# Altium footprint library LukaLIBRARY.PcbLib: 772 footprints (part 20 of 49)
Each footprint in its own frame and in the unit in brackets; x right, y up, seen from the top. Pads: shape width x height; smd on the part's side, far side on the other; paste and mask are expansions set on the pad; w line width, h text height; cw(c..) or ccw(c..) is an arc to the next point about the centre after c.
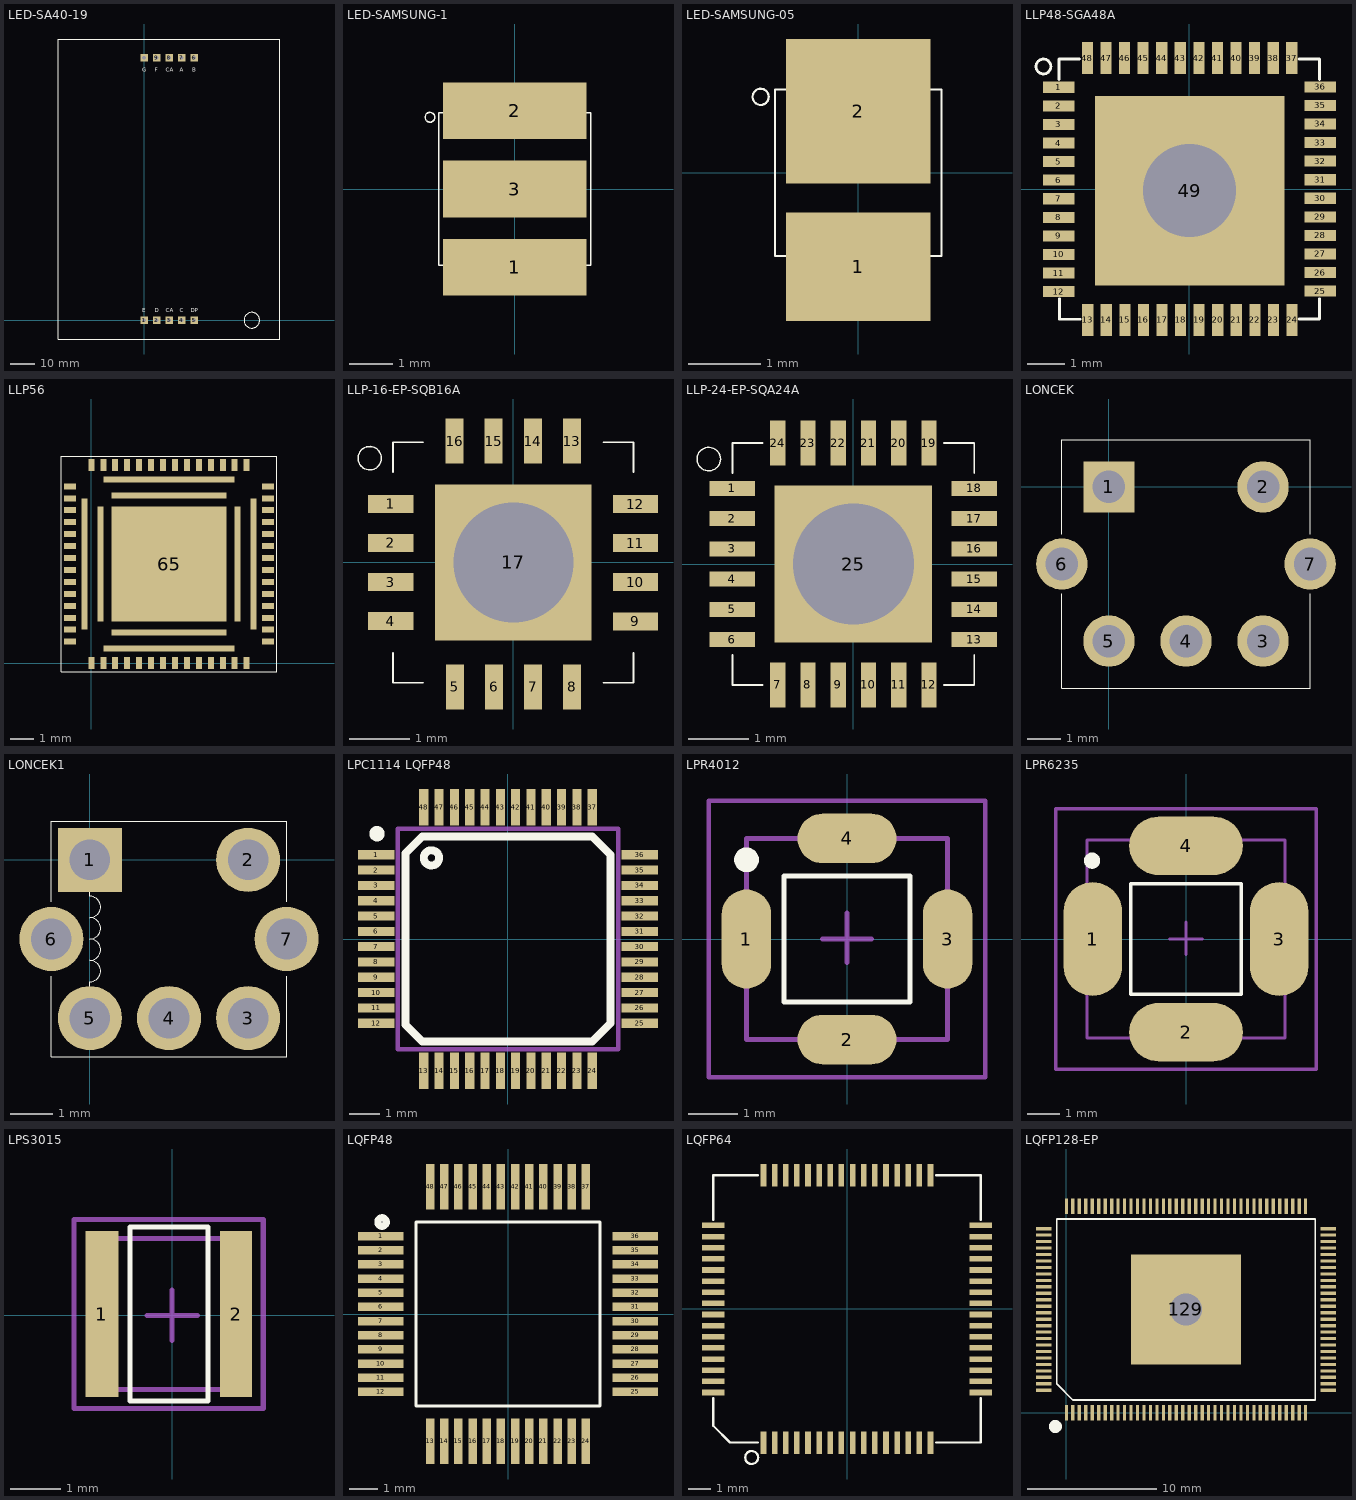
[diagram p19: the footprints below, top view; thin cyan lines are the x and y axes]

## LED-SA40-19 [mil]
pads (10):
  rect 120x120 hole 60 mask-1000: 1(0,0) 2(200,0) 3(400,0) 4(600,0) 5(800,0) 6(800,4200) 7(600,4200) 8(400,4200) 9(200,4200) 10(0,4200)
Top Overlay:
  circle w3.94: c1725,0 r125
  lines w3.94: -1375,-300 2175,-300 2175,4500 -1375,4500 -1375,-300
  text "A" at 575,3975 h62.5
  text "C" at 575,125 h62.5
  text "G" at -25,3975 h62.5
  text "E" at -25,125 h62.5
  text "B" at 775,3975 h62.5
  text "DP" at 750,125 h62.5
  text "CA" at 350,3975 h62.5
  text "CA" at 350,125 h62.5
  text "F" at 175,3975 h62.5
  text "D" at 175,125 h62.5
Top Solder:
  region: 660,4140 660,4260 540,4260 540,4140
  region: 660,-60 660,60 540,60 540,-60
  region: 60,4140 60,4260 -60,4260 -60,4140
  region: 60,-60 60,60 -60,60 -60,-60
  region: 860,4140 860,4260 740,4260 740,4140
  region: 860,-60 860,60 740,60 740,-60
  region: 460,4140 460,4260 340,4260 340,4140
  region: 460,-60 460,60 340,60 340,-60
  region: 260,4140 260,4260 140,4260 140,4140
  region: 260,-60 260,60 140,60 140,-60
Bottom Solder:
  region: 660,4140 660,4260 540,4260 540,4140
  region: 660,-60 660,60 540,60 540,-60
  region: 60,4140 60,4260 -60,4260 -60,4140
  region: 60,-60 60,60 -60,60 -60,-60
  region: 860,4140 860,4260 740,4260 740,4140
  region: 860,-60 860,60 740,60 740,-60
  region: 460,4140 460,4260 340,4260 340,4140
  region: 460,-60 460,60 340,60 340,-60
  region: 260,4140 260,4260 140,4260 140,4140
  region: 260,-60 260,60 140,60 140,-60

## LED-SAMSUNG-1 [mm]
pads (3):
  rect 3.3x1.3 smd: 1(0,-1.8) 2(0,1.8) 3(0,0)
Top Overlay:
  circle w0.03: c-1.95,1.65 r0.112
  lines w0.03: -1.75,-1.75 1.75,-1.75 1.75,1.75 -1.75,1.75 -1.75,-1.75

## LED-SAMSUNG-05 [mm]
pads (2):
  rect 2x1.5 smd: 1(0,-1.3)
  rect 2x2 smd: 2(0,0.85)
Top Overlay:
  circle w0.03: c-1.35,1.05 r0.112
  lines w0.03: -1.15,-1.15 1.15,-1.15 1.15,1.15 -1.15,1.15 -1.15,-1.15

## LLP48-SGA48A [mm]
pads (49):
  rect 0.85x0.3 smd mask-25.4: 1(-3.521,2.742) 2(-3.521,2.242) 3(-3.521,1.742) 4(-3.521,1.242) 5(-3.521,0.742) 6(-3.521,0.242) 7(-3.521,-0.258) 8(-3.521,-0.758) 9(-3.521,-1.258) 10(-3.521,-1.758) 11(-3.521,-2.258) 12(-3.521,-2.758) 25(3.519,-2.745) 26(3.519,-2.245) 27(3.519,-1.745) 28(3.519,-1.245) 29(3.519,-0.745) 30(3.519,-0.245) 31(3.519,0.255) 32(3.519,0.755) 33(3.519,1.255) 34(3.519,1.755) 35(3.519,2.255) 36(3.519,2.755)
  rect 0.3x0.85 smd mask-25.4: 13(-2.74,-3.522) 14(-2.24,-3.522) 15(-1.74,-3.522) 16(-1.24,-3.522) 17(-0.74,-3.522) 18(-0.24,-3.522) 19(0.26,-3.522) 20(0.76,-3.522) 21(1.26,-3.522) 22(1.76,-3.522) 23(2.26,-3.522) 24(2.76,-3.522) 37(2.753,3.531) 38(2.253,3.531) 39(1.753,3.531) 40(1.253,3.531) 41(0.753,3.531) 42(0.253,3.531) 43(-0.247,3.531) 44(-0.747,3.531) 45(-1.247,3.531) 46(-1.747,3.531) 47(-2.247,3.531) 48(-2.747,3.531)
  rect 5.1x5.1 hole 2.5 unplated mask-25.4: 49(0.003,-0.039)
Top Overlay:
  circle w0.076: c-3.932,3.302 r0.2
  lines w0.076: -3.509,2.95 -3.509,3.5 -2.959,3.5 ; -3.5,-3.5 -2.95,-3.5 ; -3.498,-3.499 -3.498,-2.949 ; 2.948,-3.498 3.498,-3.498 ; 2.948,3.501 3.498,3.501 ; 3.5,-3.498 3.5,-2.948 ; 3.5,2.952 3.5,3.502
Top Solder:
  drawing of 49 lines, arcs and shapes, not listed
Bottom Solder:
  region: -2.559,-0.039 -2.51,-0.539 -2.364,-1.02 -2.128,-1.463 -1.809,-1.851 -1.421,-2.17 -0.978,-2.406 -0.497,-2.552 0.003,-2.601 0.503,-2.552 0.984,-2.406 1.427,-2.17 1.815,-1.851 2.133,-1.463 2.37,-1.02 2.516,-0.539 2.565,-0.039 2.516,0.461 2.37,0.942 2.133,1.385 1.815,1.773 1.427,2.092 0.984,2.328 0.503,2.474 0.003,2.523 -0.497,2.474 -0.978,2.328 -1.421,2.092 -1.809,1.773 -2.128,1.385 -2.364,0.942 -2.51,0.461

## LLP56 [mm]
pads (65):
  rect 0.25x0.5 smd paste-25.4 mask-25.4: 1(0,0) 2(0.5,0) 3(1,0) 4(1.5,0) 5(2,0) 6(2.5,0) 7(3,0) 8(3.5,0) 9(4,0) 10(4.5,0) 11(5,0) 12(5.5,0) 13(6,0) 14(6.5,0) 29(6.5,8.3) 30(6,8.3) 31(5.5,8.3) 32(5,8.3) 33(4.5,8.3) 34(4,8.3) 35(3.5,8.3) 36(3,8.3) 37(2.5,8.3) 38(2,8.3) 39(1.5,8.3) 40(1,8.3) 41(0.5,8.3) 42(0,8.3)
  rect 0.5x0.25 smd paste-25.4 mask-25.4: 15(7.4,0.9) 16(7.4,1.4) 17(7.4,1.9) 18(7.4,2.4) 19(7.4,2.9) 20(7.4,3.4) 21(7.4,3.9) 22(7.4,4.4) 23(7.4,4.9) 24(7.4,5.4) 25(7.4,5.9) 26(7.4,6.4) 27(7.4,6.9) 28(7.4,7.4) 43(-0.9,7.4) 44(-0.9,6.9) 45(-0.9,6.4) 46(-0.9,5.9) 47(-0.9,5.4) 48(-0.9,4.9) 49(-0.9,4.4) 50(-0.9,3.9) 51(-0.9,3.4) 52(-0.9,2.9) 53(-0.9,2.4) 54(-0.9,1.9) 55(-0.9,1.4) 56(-0.9,0.9)
  rect 5.5x0.25 smd mask-25.4: 57(3.25,0.625) 61(3.25,7.675)
  rect 4.8x0.25 smd mask-25.4: 58(3.25,1.275) 62(3.25,7.025)
  rect 0.25x5.5 smd mask-25.4: 59(-0.275,4.15) 63(6.775,4.15)
  rect 0.25x4.8 smd mask-25.4: 60(0.375,4.15) 64(6.125,4.15)
  rect 4.8x4.8 smd mask-25.4: 65(3.25,4.15)
Top Overlay:
  lines w0.025: -1.25,-0.35 -1.25,8.65 7.75,8.65 7.75,-0.35 -1.25,-0.35
Top Paste:
  drawing of 152 lines, arcs and shapes, not listed
Top Solder:
  drawing of 65 lines, arcs and shapes, not listed

## LLP-16-EP-SQB16A [mm]
pads (17):
  rect 0.75x0.3 smd mask-25.4: 1(-2.04,0.975) 2(-2.04,0.325) 3(-2.04,-0.325) 4(-2.04,-0.975) 9(2.03,-0.978) 10(2.03,-0.327) 11(2.03,0.323) 12(2.03,0.972)
  rect 0.3x0.75 smd mask-25.4: 5(-0.972,-2.07) 6(-0.323,-2.07) 7(0.327,-2.07) 8(0.978,-2.07) 13(0.972,2.02) 14(0.323,2.02) 15(-0.327,2.02) 16(-0.978,2.02)
  rect 2.6x2.6 hole 2 unplated mask-25.4: 17(0,0)
Top Overlay:
  circle w0.025: c-2.39,1.735 r0.194
  lines w0.03: -2,-1.5 -2,-2 -1.5,-2 ; -2,1.5 -2,2 -1.5,2 ; 1.5,-2 2,-2 2,-1.5 ; 1.5,2 2,2 2,1.5
Top Solder:
  region: -1.665,0.825 -1.665,1.125 -2.415,1.125 -2.415,0.825
  region: -1.665,0.175 -1.665,0.475 -2.415,0.475 -2.415,0.175
  region: -1.665,-0.475 -1.665,-0.175 -2.415,-0.175 -2.415,-0.475
  region: -1.665,-1.125 -1.665,-0.825 -2.415,-0.825 -2.415,-1.125
  region: -0.473,-2.445 -0.173,-2.445 -0.173,-1.695 -0.473,-1.695
  region: 0.477,-1.695 0.178,-1.695 0.178,-2.445 0.477,-2.445
  region: 0.473,2.395 0.173,2.395 0.173,1.645 0.473,1.645
  region: -0.477,1.645 -0.178,1.645 -0.178,2.395 -0.477,2.395
  region: -0.828,2.395 -1.128,2.395 -1.128,1.645 -0.828,1.645
  region: -0.823,-1.695 -1.122,-1.695 -1.122,-2.445 -0.823,-2.445
  region: 2.405,-1.128 2.405,-0.828 1.655,-0.828 1.655,-1.128
  region: 2.405,-0.477 2.405,-0.178 1.655,-0.178 1.655,-0.477
  region: 2.405,0.173 2.405,0.473 1.655,0.473 1.655,0.173
  region: 2.405,0.823 2.405,1.122 1.655,1.122 1.655,0.823
  region: 0.828,-2.445 1.128,-2.445 1.128,-1.695 0.828,-1.695
  region: 1.122,2.395 0.823,2.395 0.823,1.645 1.122,1.645
  region: -1.3,-1.3 1.3,-1.3 1.3,1.3 -1.3,1.3
Bottom Solder:
  region: -1.5,-1.5 1.5,-1.5 1.5,1.5 -1.5,1.5

## LLP-24-EP-SQA24A [mm]
pads (25):
  rect 0.75x0.25 smd mask-25.4: 1(-2,1.25) 2(-2,0.75) 3(-2,0.25) 4(-2,-0.25) 5(-2,-0.75) 6(-2,-1.25) 13(2,-1.25) 14(2,-0.75) 15(2,-0.25) 16(2,0.25) 17(2,0.75) 18(2,1.25)
  rect 0.25x0.75 smd mask-25.4: 7(-1.25,-2) 8(-0.75,-2) 9(-0.25,-2) 10(0.25,-2) 11(0.75,-2) 12(1.25,-2) 19(1.25,2) 20(0.75,2) 21(0.25,2) 22(-0.25,2) 23(-0.75,2) 24(-1.25,2)
  rect 2.6x2.6 hole 2 unplated mask-25.4: 25(0,0)
Top Overlay:
  circle w0.025: c-2.39,1.735 r0.194
  lines w0.03: -2,-1.5 -2,-2 -1.5,-2 ; -2,1.5 -2,2 -1.5,2 ; 1.5,-2 2,-2 2,-1.5 ; 1.5,2 2,2 2,1.5
Top Solder:
  region: -1.625,0.125 -1.625,0.375 -2.375,0.375 -2.375,0.125
  region: -1.625,-0.375 -1.625,-0.125 -2.375,-0.125 -2.375,-0.375
  region: -1.625,-0.875 -1.625,-0.625 -2.375,-0.625 -2.375,-0.875
  region: -1.625,1.125 -1.625,1.375 -2.375,1.375 -2.375,1.125
  region: -1.625,0.625 -1.625,0.875 -2.375,0.875 -2.375,0.625
  region: -1.125,-1.625 -1.375,-1.625 -1.375,-2.375 -1.125,-2.375
  region: -0.875,-2.375 -0.625,-2.375 -0.625,-1.625 -0.875,-1.625
  region: -0.375,-2.375 -0.125,-2.375 -0.125,-1.625 -0.375,-1.625
  region: 0.125,-2.375 0.375,-2.375 0.375,-1.625 0.125,-1.625
  region: 0.625,-2.375 0.875,-2.375 0.875,-1.625 0.625,-1.625
  region: 0.875,2.375 0.625,2.375 0.625,1.625 0.875,1.625
  region: 0.375,2.375 0.125,2.375 0.125,1.625 0.375,1.625
  region: -0.375,1.625 -0.125,1.625 -0.125,2.375 -0.375,2.375
  region: -0.875,1.625 -0.625,1.625 -0.625,2.375 -0.875,2.375
  region: -1.375,1.625 -1.125,1.625 -1.125,2.375 -1.375,2.375
  region: -2.375,-1.125 -2.375,-1.375 -1.625,-1.375 -1.625,-1.125
  region: 1.125,-2.375 1.375,-2.375 1.375,-1.625 1.125,-1.625
  region: 2.375,-1.375 2.375,-1.125 1.625,-1.125 1.625,-1.375
  region: 2.375,-0.875 2.375,-0.625 1.625,-0.625 1.625,-0.875
  region: 1.625,-0.125 1.625,-0.375 2.375,-0.375 2.375,-0.125
  region: 2.375,0.125 2.375,0.375 1.625,0.375 1.625,0.125
  region: 2.375,1.125 2.375,1.375 1.625,1.375 1.625,1.125
  region: 2.375,0.625 2.375,0.875 1.625,0.875 1.625,0.625
  region: 1.375,2.375 1.125,2.375 1.125,1.625 1.375,1.625
  region: -1.3,-1.3 1.3,-1.3 1.3,1.3 -1.3,1.3
Bottom Solder:
  region: -1.5,-1.5 1.5,-1.5 1.5,1.5 -1.5,1.5

## LONCEK [mil]
pads (7):
  rect 60x60 hole 38 mask-1000: 1(0,0)
  round 60 hole 38 mask-1000: 2(180,0) 3(180,-180) 4(90,-180) 5(0,-180) 6(-55,-90) 7(235,-90)
Top Overlay:
  lines w1: -55,-125 -55,-235 235,-235 235,-125 ; -55,-55 -55,55 235,55 235,-55
Top Solder:
  drawing of 7 lines, arcs and shapes, not listed
Bottom Solder:
  drawing of 7 lines, arcs and shapes, not listed

## LONCEK1 [mil]
pads (7):
  rect 60x60 hole 38 mask-1000: 1(0,0)
  round 60 hole 38 mask-1000: 2(148,0) 3(148,-148) 4(74,-148) 5(0,-148) 6(-36,-74) 7(184,-74)
Top Overlay:
  lines w1: -36,-109 -36,-184 184,-184 184,-109 ; -36,-39 -36,36 184,36 184,-39 ; 0,-119 0,-114 ccw(c0,-104) 0,-94 ccw(c0,-84) 0,-74 ccw(c0,-64) 0,-54 ccw(c0,-44) 0,-34 0,-29
Top Solder:
  drawing of 7 lines, arcs and shapes, not listed
Bottom Solder:
  drawing of 7 lines, arcs and shapes, not listed

## LPC1114 LQFP48 [mm]
pads (48):
  rect 1.2x0.3 smd: 1(-4.3,2.75) 2(-4.3,2.25) 3(-4.3,1.75) 4(-4.3,1.25) 5(-4.3,0.75) 6(-4.3,0.25) 7(-4.3,-0.25) 8(-4.3,-0.75) 9(-4.3,-1.25) 10(-4.3,-1.75) 11(-4.3,-2.25) 12(-4.3,-2.75) 25(4.3,-2.75) 26(4.3,-2.25) 27(4.3,-1.75) 28(4.3,-1.25) 29(4.3,-0.75) 30(4.3,-0.25) 31(4.3,0.25) 32(4.3,0.75) 33(4.3,1.25) 34(4.3,1.75) 35(4.3,2.25) 36(4.3,2.75)
  rect 0.3x1.2 smd: 13(-2.75,-4.3) 14(-2.25,-4.3) 15(-1.75,-4.3) 16(-1.25,-4.3) 17(-0.75,-4.3) 18(-0.25,-4.3) 19(0.25,-4.3) 20(0.75,-4.3) 21(1.25,-4.3) 22(1.75,-4.3) 23(2.25,-4.3) 24(2.75,-4.3) 37(2.75,4.3) 38(2.25,4.3) 39(1.75,4.3) 40(1.25,4.3) 41(0.75,4.3) 42(0.25,4.3) 43(-0.25,4.3) 44(-0.75,4.3) 45(-1.25,4.3) 46(-1.75,4.3) 47(-2.25,4.3) 48(-2.75,4.3)
Top Overlay:
  circle w0.254: c-2.5,2.65 r0.25
  circle w0.25: c-4.282,3.439 r0.125
  lines w0.254: -3.35,-2.8 -2.8,-3.35 2.75,-3.35 3.35,-2.75 3.35,2.75 2.75,3.35 -2.8,3.35 -3.35,2.8 -3.35,-2.8
Mechanical 1:
  lines w0.15: -3.6,-3.6 3.6,-3.6 3.6,3.6 -3.6,3.6 -3.6,-3.6

## LPR4012 [mm] "4.0 x 4.0mm"
pads (4):
  oval 1x2 smd: 1(-2.032,0) 3(2.032,0)
  oval 2x1 smd: 2(0,-2.032) 4(0,2.032)
Top Overlay:
  circle w0.25: c-2.03,1.6 r0.125
  lines w0.1: -1.27,-1.27 1.27,-1.27 1.27,1.27 -1.27,1.27 -1.27,-1.27
Mechanical 13:
  lines w0.1: -2.032,-2.032 -2.032,2.032 2.032,2.032 2.032,-2.032 -2.032,-2.032
Mechanical 15:
  lines w0.1: -0.5,0 0.5,0 ; 0,-0.475 0,0.525 ; -2.794,-2.794 2.794,-2.794 2.794,2.794 -2.794,2.794 -2.794,-2.794

## LPR6235 [mm] "6.0 x 6.0mm"
pads (4):
  oval 1.8x3.5 smd: 1(-2.87,0) 3(2.87,0)
  oval 3.5x1.8 smd: 2(0,-2.87) 4(0,2.87)
Top Overlay:
  circle w0.25: c-2.894,2.413 r0.125
  lines w0.1: -1.702,-1.702 -1.702,1.702 1.702,1.702 1.702,-1.702 -1.702,-1.702
Mechanical 13:
  lines w0.1: -3.048,-3.048 3.048,-3.048 3.048,3.048 -3.048,3.048 -3.048,-3.048
Mechanical 15:
  lines w0.1: -0.5,0 0.5,0 ; 0,-0.475 0,0.525 ; -4.013,-4.013 -4.013,4.013 4.013,4.013 4.014,-4.013 -4.013,-4.013

## LPS3015 [mm] "3.0 x 3.0mm"
pads (2):
  rect 0.65x3.3 smd: 1(-1.397,0.025)
  rect 0.63x3.3 smd: 2(1.27,0.025)
Top Overlay:
  lines w0.1: -0.838,-1.702 -0.838,1.753 0.711,1.753 0.711,-1.702 -0.838,-1.702
Mechanical 13:
  lines w0.1: -1.575,-1.475 1.425,-1.475 1.425,1.525 -1.575,1.525 -1.575,-1.475
Mechanical 15:
  lines w0.1: -0.5,0 0.5,0 ; 0,-0.5 0,0.5 ; -1.956,-1.854 -1.956,1.905 1.811,1.905 1.811,-1.854 -1.956,-1.854

## LQFP48 [mm]
pads (48):
  rect 1.6x0.3 smd: 1(-4.5,2.75) 2(-4.5,2.25) 3(-4.5,1.75) 4(-4.5,1.25) 5(-4.5,0.75) 6(-4.5,0.25) 7(-4.5,-0.25) 8(-4.5,-0.75) 9(-4.5,-1.25) 10(-4.5,-1.75) 11(-4.5,-2.25) 12(-4.5,-2.75) 25(4.5,-2.75) 26(4.5,-2.25) 27(4.5,-1.75) 28(4.5,-1.25) 29(4.5,-0.75) 30(4.5,-0.25) 31(4.5,0.25) 32(4.5,0.75) 33(4.5,1.25) 34(4.5,1.75) 35(4.5,2.25) 36(4.5,2.75)
  rect 0.3x1.6 smd: 13(-2.75,-4.5) 14(-2.25,-4.5) 15(-1.75,-4.5) 16(-1.25,-4.5) 17(-0.75,-4.5) 18(-0.25,-4.5) 19(0.25,-4.5) 20(0.75,-4.5) 21(1.25,-4.5) 22(1.75,-4.5) 23(2.25,-4.5) 24(2.75,-4.5) 37(2.75,4.5) 38(2.25,4.5) 39(1.75,4.5) 40(1.25,4.5) 41(0.75,4.5) 42(0.25,4.5) 43(-0.25,4.5) 44(-0.75,4.5) 45(-1.25,4.5) 46(-1.75,4.5) 47(-2.25,4.5) 48(-2.75,4.5)
Top Overlay:
  circle w0.25: c-4.45,3.25 r0.15
  lines w0.1: -3.25,-3.25 3.25,-3.25 3.25,3.25 -3.25,3.25 -3.25,-3.25

## LQFP64 [mm]
pads (64):
  rect 0.25x1.016 smd mask-25.4: 1(-3.75,-6) 2(-3.25,-6) 3(-2.75,-6) 4(-2.25,-6) 5(-1.75,-6) 6(-1.25,-6) 7(-0.75,-6) 8(-0.25,-6) 9(0.25,-6) 10(0.75,-6) 11(1.25,-6) 12(1.75,-6) 13(2.25,-6) 14(2.75,-6) 15(3.25,-6) 16(3.75,-6) 33(3.75,6) 34(3.25,6) 35(2.75,6) 36(2.25,6) 37(1.75,6) 38(1.25,6) 39(0.75,6) 40(0.25,6) 41(-0.25,6) 42(-0.75,6) 43(-1.25,6) 44(-1.75,6) 45(-2.25,6) 46(-2.75,6) 47(-3.25,6) 48(-3.75,6)
  rect 1.016x0.25 smd mask-25.4: 17(6,-3.75) 18(6,-3.25) 19(6,-2.75) 20(6,-2.25) 21(6,-1.75) 22(6,-1.25) 23(6,-0.75) 24(6,-0.25) 25(6,0.25) 26(6,0.75) 27(6,1.25) 28(6,1.75) 29(6,2.25) 30(6,2.75) 31(6,3.25) 32(6,3.75) 49(-6,3.75) 50(-6,3.25) 51(-6,2.75) 52(-6,2.25) 53(-6,1.75) 54(-6,1.25) 55(-6,0.75) 56(-6,0.25) 57(-6,-0.25) 58(-6,-0.75) 59(-6,-1.25) 60(-6,-1.75) 61(-6,-2.25) 62(-6,-2.75) 63(-6,-3.25) 64(-6,-3.75)
Top Overlay:
  circle w0.1: c-4.28,-6.67 r0.291
  lines w0.1: -6,-4 -6,-5.25 -5.25,-6 -4,-6 ; -6,4 -6,6 -4,6 ; 4,-6 6,-6 6,-4 ; 4,6 6,6 6,4
Top Solder:
  drawing of 64 lines, arcs and shapes, not listed

## LQFP128-EP [mm]
pads (129):
  rect 0.25x1.2 smd mask-25.4: 1(0,0) 2(0.5,0) 3(1,0) 4(1.5,0) 5(2,0) 6(2.5,0) 7(3,0) 8(3.5,0) 9(4,0) 10(4.5,0) 11(5,0) 12(5.5,0) 13(6,0) 14(6.5,0) 15(7,0) 16(7.5,0) 17(8,0) 18(8.5,0) 19(9,0) 20(9.5,0) 21(10,0) 22(10.5,0) 23(11,0) 24(11.5,0) 25(12,0) 26(12.5,0) 27(13,0) 28(13.5,0) 29(14,0) 30(14.5,0) 31(15,0) 32(15.5,0) 33(16,0) 34(16.5,0) 35(17,0) 36(17.5,0) 37(18,0) 38(18.5,0) 65(18.5,16) 66(18,16) 67(17.5,16) 68(17,16) 69(16.5,16) 70(16,16) 71(15.5,16) 72(15,16) 73(14.5,16) 74(14,16) 75(13.5,16) 76(13,16) 77(12.5,16) 78(12,16) 79(11.5,16) 80(11,16) 81(10.5,16) 82(10,16) 83(9.5,16) 84(9,16) 85(8.5,16) 86(8,16) 87(7.5,16) 88(7,16) 89(6.5,16) 90(6,16) 91(5.5,16) 92(5,16) 93(4.5,16) 94(4,16) 95(3.5,16) 96(3,16) 97(2.5,16) 98(2,16) 99(1.5,16) 100(1,16) 101(0.5,16) 102(0,16)
  rect 1.2x0.25 smd mask-25.4: 39(20.25,1.75) 40(20.25,2.25) 41(20.25,2.75) 42(20.25,3.25) 43(20.25,3.75) 44(20.25,4.25) 45(20.25,4.75) 46(20.25,5.25) 47(20.25,5.75) 48(20.25,6.25) 49(20.25,6.75) 50(20.25,7.25) 51(20.25,7.75) 52(20.25,8.25) 53(20.25,8.75) 54(20.25,9.25) 55(20.25,9.75) 56(20.25,10.25) 57(20.25,10.75) 58(20.25,11.25) 59(20.25,11.75) 60(20.25,12.25) 61(20.25,12.75) 62(20.25,13.25) 63(20.25,13.75) 64(20.25,14.25) 103(-1.75,14.25) 104(-1.75,13.75) 105(-1.75,13.25) 106(-1.75,12.75) 107(-1.75,12.25) 108(-1.75,11.75) 109(-1.75,11.25) 110(-1.75,10.75) 111(-1.75,10.25) 112(-1.75,9.75) 113(-1.75,9.25) 114(-1.75,8.75) 115(-1.75,8.25) 116(-1.75,7.75) 117(-1.75,7.25) 118(-1.75,6.75) 119(-1.75,6.25) 120(-1.75,5.75) 121(-1.75,5.25) 122(-1.75,4.75) 123(-1.75,4.25) 124(-1.75,3.75) 125(-1.75,3.25) 126(-1.75,2.75) 127(-1.75,2.25) 128(-1.75,1.75)
  rect 8.5x8.5 hole 2.5 unplated mask-25.4: 129(9.25,8)
Top Overlay:
  circle w0.5: c-0.85,-1.05 r0.25
  lines w0.127: -0.75,2.25 0.5,1 19.25,1 19.25,15 -0.75,15 -0.75,2.25
Top Solder:
  drawing of 129 lines, arcs and shapes, not listed
Bottom Solder:
  region: 5,3.75 13.5,3.75 13.5,12.25 5,12.25